# Altium schematic symbol library jlcpcb_2025_04_capacitors_extended_0603.schlib: 3668 symbols (part 16 of 20) (continued)
## GRM188C81C225KA12D
designator C?  Capacitance: 2.2uF  (hidden comment: *)
Capacitor, Ceramic (MLCC), 2.2uF, ±10%, 16V, X6S, ±10%, SMD 0603; Manufacturer: Murata Electronics; Manufacturer Part Number: GRM188C81C225KA12D; Package Size: 0603; JLCPCB Basic Part: No; JLCPCB Part Number: C524624; Supplier 1: LCSC; Category: Capacitors - MLCC; Supplier Part Number 1: C524624; Tolerance: ±10%; Voltage Rating: 16V; Temperature Coefficient: X6S; RoHS: Yes; ComponentLink1Description: Datasheet; ComponentLink1URL: https://wmsc.lcsc.com/wmsc/upload/file/pdf/v2/lcsc/2304140030_Murata-Electronics-GRM188C81C225KA12D_C524624.pdf; ComponentLink2Description: JLCPCB Part URL; ComponentLink2URL: https://jlcpcb.com/partdetail/C524624; ComponentLink3Description: LCSC Part URL; ComponentLink3URL: https://lcsc.com/product-detail/Multilayer-Ceramic-Capacitors-MLCC---SMD-SMT_Murata-Electronics-Murata-Electronics-GRM188C81C225KA12D_C524624.html
footprint CAP-0603 (0603 (1608M) Capacitor)
pins: 1, 2

## GRM188C81C475KE11D
designator C?  Capacitance: 4.7uF  (hidden comment: *)
Capacitor, Ceramic (MLCC), 4.7uF, ±10%, 16V, X6S, ±10%, SMD 0603; Manufacturer: Murata Electronics; Manufacturer Part Number: GRM188C81C475KE11D; Package Size: 0603; JLCPCB Basic Part: No; JLCPCB Part Number: C464980; Supplier 1: LCSC; Category: Capacitors - MLCC; Supplier Part Number 1: C464980; Tolerance: ±10%; Voltage Rating: 16V; Temperature Coefficient: X6S; RoHS: Yes; ComponentLink1Description: Datasheet; ComponentLink1URL: https://wmsc.lcsc.com/wmsc/upload/file/pdf/v2/lcsc/1912111437_Murata-Electronics-GRM188C81C475KE11D_C464980.pdf; ComponentLink2Description: JLCPCB Part URL; ComponentLink2URL: https://jlcpcb.com/partdetail/C464980; ComponentLink3Description: LCSC Part URL; ComponentLink3URL: https://lcsc.com/product-detail/Multilayer-Ceramic-Capacitors-MLCC---SMD-SMT_Murata-Electronics-Murata-Electronics-GRM188C81C475KE11D_C464980.html
footprint CAP-0603 (0603 (1608M) Capacitor)
pins: 1, 2

## GRM188C81E225KE11D
designator C?  Capacitance: 2.2uF  (hidden comment: *)
Capacitor, Ceramic (MLCC), 2.2uF, ±10%, 25V, X6S, ±10%, SMD 0603; Manufacturer: Murata Electronics; Manufacturer Part Number: GRM188C81E225KE11D; Package Size: 0603; JLCPCB Basic Part: No; JLCPCB Part Number: C464411; Supplier 1: LCSC; Category: Capacitors - MLCC; Supplier Part Number 1: C464411; Tolerance: ±10%; Voltage Rating: 25V; Temperature Coefficient: X6S; RoHS: Yes; ComponentLink1Description: Datasheet; ComponentLink1URL: https://wmsc.lcsc.com/wmsc/upload/file/pdf/v2/lcsc/2304140030_Murata-Electronics-GRM188C81E225KE11D_C464411.pdf; ComponentLink2Description: JLCPCB Part URL; ComponentLink2URL: https://jlcpcb.com/partdetail/C464411; ComponentLink3Description: LCSC Part URL; ComponentLink3URL: https://lcsc.com/product-detail/Multilayer-Ceramic-Capacitors-MLCC---SMD-SMT_Murata-Electronics-Murata-Electronics-GRM188C81E225KE11D_C464411.html
footprint CAP-0603 (0603 (1608M) Capacitor)
pins: 1, 2

## GRM188C81E475KE11D
designator C?  Capacitance: 4.7uF  (hidden comment: *)
Capacitor, Ceramic (MLCC), 4.7uF, ±10%, 25V, X6S, ±10%, SMD 0603; Manufacturer: Murata Electronics; Manufacturer Part Number: GRM188C81E475KE11D; Package Size: 0603; JLCPCB Basic Part: No; JLCPCB Part Number: C417145; Supplier 1: LCSC; Category: Capacitors - MLCC; Supplier Part Number 1: C417145; Tolerance: ±10%; Voltage Rating: 25V; Temperature Coefficient: X6S; RoHS: Yes; ComponentLink1Description: Datasheet; ComponentLink1URL: https://wmsc.lcsc.com/wmsc/upload/file/pdf/v2/lcsc/2012241539_Murata-Electronics-GRM188C81E475KE11D_C417145.pdf; ComponentLink2Description: JLCPCB Part URL; ComponentLink2URL: https://jlcpcb.com/partdetail/C417145; ComponentLink3Description: LCSC Part URL; ComponentLink3URL: https://lcsc.com/product-detail/Multilayer-Ceramic-Capacitors-MLCC---SMD-SMT_Murata-Electronics-Murata-Electronics-GRM188C81E475KE11D_C417145.html
footprint CAP-0603 (0603 (1608M) Capacitor)
pins: 1, 2

## GRM188D71A106KA73D
designator C?  Capacitance: 10uF  (hidden comment: *)
Capacitor, Ceramic (MLCC), 10uF, ±10%, 10V, X7T, ±10%, SMD 0603; Manufacturer: Murata Electronics; Manufacturer Part Number: GRM188D71A106KA73D; Package Size: 0603; JLCPCB Basic Part: No; JLCPCB Part Number: C385037; Supplier 1: LCSC; Category: Capacitors - MLCC; Supplier Part Number 1: C385037; Tolerance: ±10%; Voltage Rating: 10V; Temperature Coefficient: X7T; RoHS: Yes; ComponentLink1Description: Datasheet; ComponentLink1URL: https://wmsc.lcsc.com/wmsc/upload/file/pdf/v2/lcsc/1912111437_Murata-Electronics-GRM188D71A106KA73D_C385037.pdf; ComponentLink2Description: JLCPCB Part URL; ComponentLink2URL: https://jlcpcb.com/partdetail/C385037; ComponentLink3Description: LCSC Part URL; ComponentLink3URL: https://lcsc.com/product-detail/Multilayer-Ceramic-Capacitors-MLCC---SMD-SMT_Murata-Electronics-Murata-Electronics-GRM188D71A106KA73D_C385037.html
footprint CAP-0603 (0603 (1608M) Capacitor)
pins: 1, 2

## GRM188D71A106MA73D
designator C?  Capacitance: 10uF  (hidden comment: *)
Capacitor, Ceramic (MLCC), 10uF, ±20%, 10V, X7T, ±20%, SMD 0603; Manufacturer: Murata Electronics; Manufacturer Part Number: GRM188D71A106MA73D; Package Size: 0603; JLCPCB Basic Part: No; JLCPCB Part Number: C162270; Supplier 1: LCSC; Category: Capacitors - MLCC; Supplier Part Number 1: C162270; Tolerance: ±20%; Voltage Rating: 10V; Temperature Coefficient: X7T; RoHS: Yes; ComponentLink1Description: Datasheet; ComponentLink1URL: https://wmsc.lcsc.com/wmsc/upload/file/pdf/v2/lcsc/1912111437_Murata-Electronics-GRM188D71A106MA73D_C162270.pdf; ComponentLink2Description: JLCPCB Part URL; ComponentLink2URL: https://jlcpcb.com/partdetail/C162270; ComponentLink3Description: LCSC Part URL; ComponentLink3URL: https://lcsc.com/product-detail/Multilayer-Ceramic-Capacitors-MLCC---SMD-SMT_Murata-Electronics-Murata-Electronics-GRM188D71A106MA73D_C162270.html
footprint CAP-0603 (0603 (1608M) Capacitor)
pins: 1, 2

## GRM188D71A475ME11D
designator C?  Capacitance: 4.7uF  (hidden comment: *)
Capacitor, Ceramic (MLCC), 4.7uF, ±20%, 10V, X7T, ±20%, SMD 0603; Manufacturer: Murata Electronics; Manufacturer Part Number: GRM188D71A475ME11D; Package Size: 0603; JLCPCB Basic Part: No; JLCPCB Part Number: C1845601; Supplier 1: LCSC; Category: Capacitors - MLCC; Supplier Part Number 1: C1845601; Tolerance: ±20%; Voltage Rating: 10V; Temperature Coefficient: X7T; RoHS: Yes; ComponentLink1Description: Datasheet; ComponentLink1URL: https://wmsc.lcsc.com/wmsc/upload/file/pdf/v2/lcsc/2201270630_Murata-Electronics-GRM188D71A475ME11D_C1845601.pdf; ComponentLink2Description: JLCPCB Part URL; ComponentLink2URL: https://jlcpcb.com/partdetail/C1845601; ComponentLink3Description: LCSC Part URL; ComponentLink3URL: https://lcsc.com/product-detail/Multilayer-Ceramic-Capacitors-MLCC---SMD-SMT_Murata-Electronics-Murata-Electronics-GRM188D71A475ME11D_C1845601.html
footprint CAP-0603 (0603 (1608M) Capacitor)
pins: 1, 2

## GRM188F11E473ZA01D
designator C?  Capacitance: 47nF  (hidden comment: *)
Capacitor, Ceramic (MLCC), 47nF, 25V, SMD 0603; Manufacturer: Murata Electronics; Manufacturer Part Number: GRM188F11E473ZA01D; Temperature Rating: -20%~+80%; Package Size: 0603; JLCPCB Basic Part: No; JLCPCB Part Number: C464444; Supplier 1: LCSC; Category: Capacitors - MLCC; Supplier Part Number 1: C464444; Voltage Rating: 25V; RoHS: Yes; ComponentLink1Description: Datasheet; ComponentLink1URL: https://wmsc.lcsc.com/wmsc/upload/file/pdf/v2/lcsc/2304140030_Murata-Electronics-GRM188F11E473ZA01D_C464444.pdf; ComponentLink2Description: JLCPCB Part URL; ComponentLink2URL: https://jlcpcb.com/partdetail/C464444; ComponentLink3Description: LCSC Part URL; ComponentLink3URL: https://lcsc.com/product-detail/Multilayer-Ceramic-Capacitors-MLCC---SMD-SMT_Murata-Electronics-Murata-Electronics-GRM188F11E473ZA01D_C464444.html
footprint CAP-0603 (0603 (1608M) Capacitor)
pins: 1, 2

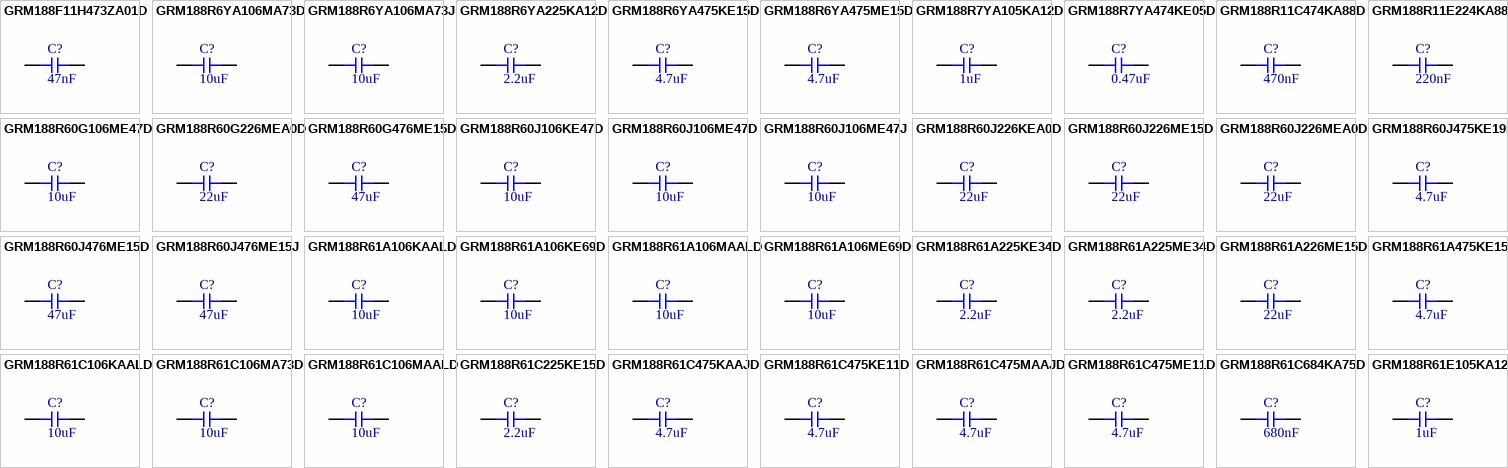
[diagram p73: symbols GRM188F11H473ZA01D to GRM188R61E105KA12D]

## GRM188F11H473ZA01D
designator C?  Capacitance: 47nF  (hidden comment: *)
Capacitor, Ceramic (MLCC), 47nF, 50V, SMD 0603; Manufacturer: Murata Electronics; Manufacturer Part Number: GRM188F11H473ZA01D; Temperature Rating: -20%~+80%; Package Size: 0603; JLCPCB Basic Part: No; JLCPCB Part Number: C86000; Supplier 1: LCSC; Category: Capacitors - MLCC; Supplier Part Number 1: C86000; Voltage Rating: 50V; RoHS: Yes; ComponentLink1Description: Datasheet; ComponentLink1URL: https://wmsc.lcsc.com/wmsc/upload/file/pdf/v2/lcsc/1810311110_Murata-Electronics-GRM188F11H473ZA01D_C86000.pdf; ComponentLink2Description: JLCPCB Part URL; ComponentLink2URL: https://jlcpcb.com/partdetail/C86000; ComponentLink3Description: LCSC Part URL; ComponentLink3URL: https://lcsc.com/product-detail/Multilayer-Ceramic-Capacitors-MLCC---SMD-SMT_Murata-Electronics-Murata-Electronics-GRM188F11H473ZA01D_C86000.html
footprint CAP-0603 (0603 (1608M) Capacitor)
pins: 1, 2

## GRM188R6YA106MA73D
designator C?  Capacitance: 10uF  (hidden comment: *)
Capacitor, Ceramic (MLCC), 10uF, ±20%, 35V, X5R, ±20%, SMD 0603; Manufacturer: Murata Electronics; Manufacturer Part Number: GRM188R6YA106MA73D; Package Size: 0603; JLCPCB Basic Part: No; JLCPCB Part Number: C194427; Supplier 1: LCSC; Category: Capacitors - MLCC; Supplier Part Number 1: C194427; Tolerance: ±20%; Voltage Rating: 35V; Temperature Coefficient: X5R; RoHS: Yes; ComponentLink1Description: Datasheet; ComponentLink1URL: https://wmsc.lcsc.com/wmsc/upload/file/pdf/v2/lcsc/2101281737_Murata-Electronics-GRM188R6YA106MA73D_C194427.pdf; ComponentLink2Description: JLCPCB Part URL; ComponentLink2URL: https://jlcpcb.com/partdetail/C194427; ComponentLink3Description: LCSC Part URL; ComponentLink3URL: https://lcsc.com/product-detail/Multilayer-Ceramic-Capacitors-MLCC---SMD-SMT_Murata-Electronics-Murata-Electronics-GRM188R6YA106MA73D_C194427.html
footprint CAP-0603 (0603 (1608M) Capacitor)
pins: 1, 2

## GRM188R6YA106MA73J
designator C?  Capacitance: 10uF  (hidden comment: *)
Capacitor, Ceramic (MLCC), 10uF, ±20%, 35V, X5R, ±20%, SMD 0603; Manufacturer: Murata Electronics; Manufacturer Part Number: GRM188R6YA106MA73J; Package Size: 0603; JLCPCB Basic Part: No; JLCPCB Part Number: C2244191; Supplier 1: LCSC; Category: Capacitors - MLCC; Supplier Part Number 1: C2244191; Tolerance: ±20%; Voltage Rating: 35V; Temperature Coefficient: X5R; RoHS: Yes; ComponentLink1Description: Datasheet; ComponentLink1URL: https://wmsc.lcsc.com/wmsc/upload/file/pdf/v2/lcsc/2104141220_Murata-Electronics-GRM188R6YA106MA73J_C2244191.pdf; ComponentLink2Description: JLCPCB Part URL; ComponentLink2URL: https://jlcpcb.com/partdetail/C2244191; ComponentLink3Description: LCSC Part URL; ComponentLink3URL: https://lcsc.com/product-detail/Multilayer-Ceramic-Capacitors-MLCC---SMD-SMT_Murata-Electronics-Murata-Electronics-GRM188R6YA106MA73J_C2244191.html
footprint CAP-0603 (0603 (1608M) Capacitor)
pins: 1, 2

## GRM188R6YA225KA12D
designator C?  Capacitance: 2.2uF  (hidden comment: *)
Capacitor, Ceramic (MLCC), 2.2uF, ±10%, 35V, X5R, ±10%, SMD 0603; Manufacturer: Murata Electronics; Manufacturer Part Number: GRM188R6YA225KA12D; Package Size: 0603; JLCPCB Basic Part: No; JLCPCB Part Number: C86017; Supplier 1: LCSC; Category: Capacitors - MLCC; Supplier Part Number 1: C86017; Tolerance: ±10%; Voltage Rating: 35V; Temperature Coefficient: X5R; RoHS: Yes; ComponentLink1Description: Datasheet; ComponentLink1URL: https://wmsc.lcsc.com/wmsc/upload/file/pdf/v2/lcsc/2304140030_Murata-Electronics-GRM188R6YA225KA12D_C86017.pdf; ComponentLink2Description: JLCPCB Part URL; ComponentLink2URL: https://jlcpcb.com/partdetail/C86017; ComponentLink3Description: LCSC Part URL; ComponentLink3URL: https://lcsc.com/product-detail/Multilayer-Ceramic-Capacitors-MLCC---SMD-SMT_Murata-Electronics-Murata-Electronics-GRM188R6YA225KA12D_C86017.html
footprint CAP-0603 (0603 (1608M) Capacitor)
pins: 1, 2

## GRM188R6YA475KE15D
designator C?  Capacitance: 4.7uF  (hidden comment: *)
Capacitor, Ceramic (MLCC), 4.7uF, ±10%, 35V, X5R, ±10%, SMD 0603; Manufacturer: Murata Electronics; Manufacturer Part Number: GRM188R6YA475KE15D; Package Size: 0603; JLCPCB Basic Part: No; JLCPCB Part Number: C162274; Supplier 1: LCSC; Category: Capacitors - MLCC; Supplier Part Number 1: C162274; Tolerance: ±10%; Voltage Rating: 35V; Temperature Coefficient: X5R; RoHS: Yes; ComponentLink1Description: Datasheet; ComponentLink1URL: https://wmsc.lcsc.com/wmsc/upload/file/pdf/v2/lcsc/2304140030_Murata-Electronics-GRM188R6YA475KE15D_C162274.pdf; ComponentLink2Description: JLCPCB Part URL; ComponentLink2URL: https://jlcpcb.com/partdetail/C162274; ComponentLink3Description: LCSC Part URL; ComponentLink3URL: https://lcsc.com/product-detail/Multilayer-Ceramic-Capacitors-MLCC---SMD-SMT_Murata-Electronics-Murata-Electronics-GRM188R6YA475KE15D_C162274.html
footprint CAP-0603 (0603 (1608M) Capacitor)
pins: 1, 2

## GRM188R6YA475ME15D
designator C?  Capacitance: 4.7uF  (hidden comment: *)
Capacitor, Ceramic (MLCC), 4.7uF, ±20%, 35V, X5R, ±20%, SMD 0603; Manufacturer: Murata Electronics; Manufacturer Part Number: GRM188R6YA475ME15D; Package Size: 0603; JLCPCB Basic Part: No; JLCPCB Part Number: C237391; Supplier 1: LCSC; Category: Capacitors - MLCC; Supplier Part Number 1: C237391; Tolerance: ±20%; Voltage Rating: 35V; Temperature Coefficient: X5R; RoHS: Yes; ComponentLink1Description: Datasheet; ComponentLink1URL: https://wmsc.lcsc.com/wmsc/upload/file/pdf/v2/lcsc/2304140030_Murata-Electronics-GRM188R6YA475ME15D_C237391.pdf; ComponentLink2Description: JLCPCB Part URL; ComponentLink2URL: https://jlcpcb.com/partdetail/C237391; ComponentLink3Description: LCSC Part URL; ComponentLink3URL: https://lcsc.com/product-detail/Multilayer-Ceramic-Capacitors-MLCC---SMD-SMT_Murata-Electronics-Murata-Electronics-GRM188R6YA475ME15D_C237391.html
footprint CAP-0603 (0603 (1608M) Capacitor)
pins: 1, 2

## GRM188R7YA105KA12D
designator C?  Capacitance: 1uF  (hidden comment: *)
Capacitor, Ceramic (MLCC), 1uF, ±10%, 35V, X7R, ±10%, SMD 0603; Manufacturer: Murata Electronics; Manufacturer Part Number: GRM188R7YA105KA12D; Package Size: 0603; JLCPCB Basic Part: No; JLCPCB Part Number: C162280; Supplier 1: LCSC; Category: Capacitors - MLCC; Supplier Part Number 1: C162280; Tolerance: ±10%; Voltage Rating: 35V; Temperature Coefficient: X7R; RoHS: Yes; ComponentLink1Description: Datasheet; ComponentLink1URL: https://wmsc.lcsc.com/wmsc/upload/file/pdf/v2/lcsc/2304140030_Murata-Electronics-GRM188R7YA105KA12D_C162280.pdf; ComponentLink2Description: JLCPCB Part URL; ComponentLink2URL: https://jlcpcb.com/partdetail/C162280; ComponentLink3Description: LCSC Part URL; ComponentLink3URL: https://lcsc.com/product-detail/Multilayer-Ceramic-Capacitors-MLCC---SMD-SMT_Murata-Electronics-Murata-Electronics-GRM188R7YA105KA12D_C162280.html
footprint CAP-0603 (0603 (1608M) Capacitor)
pins: 1, 2

## GRM188R7YA474KE05D
designator C?  Capacitance: 0.47uF  (hidden comment: *)
Capacitor, Ceramic (MLCC), 0.47uF, ±10%, 35V, X7R, ±10%, SMD 0603; Manufacturer: Murata Electronics; Manufacturer Part Number: GRM188R7YA474KE05D; Package Size: 0603; JLCPCB Basic Part: No; JLCPCB Part Number: C162281; Supplier 1: LCSC; Category: Capacitors - MLCC; Supplier Part Number 1: C162281; Tolerance: ±10%; Voltage Rating: 35V; Temperature Coefficient: X7R; RoHS: Yes; ComponentLink1Description: Datasheet; ComponentLink1URL: https://wmsc.lcsc.com/wmsc/upload/file/pdf/v2/lcsc/2308111507_Murata-Electronics-GRM188R7YA474KE05D_C162281.pdf; ComponentLink2Description: JLCPCB Part URL; ComponentLink2URL: https://jlcpcb.com/partdetail/C162281; ComponentLink3Description: LCSC Part URL; ComponentLink3URL: https://lcsc.com/product-detail/Multilayer-Ceramic-Capacitors-MLCC---SMD-SMT_Murata-Electronics-Murata-Electronics-GRM188R7YA474KE05D_C162281.html
footprint CAP-0603 (0603 (1608M) Capacitor)
pins: 1, 2

## GRM188R11C474KA88D
designator C?  Capacitance: 470nF  (hidden comment: *)
Capacitor, Ceramic (MLCC), 470nF, ±10%, 16V, R, ±10%, SMD 0603; Manufacturer: Murata Electronics; Manufacturer Part Number: GRM188R11C474KA88D; Package Size: 0603; JLCPCB Basic Part: No; JLCPCB Part Number: C415546; Supplier 1: LCSC; Category: Capacitors - MLCC; Supplier Part Number 1: C415546; Tolerance: ±10%; Voltage Rating: 16V; Temperature Coefficient: R; RoHS: Yes; ComponentLink1Description: Datasheet; ComponentLink1URL: https://wmsc.lcsc.com/wmsc/upload/file/pdf/v2/lcsc/2304140030_Murata-Electronics-GRM188R11C474KA88D_C415546.pdf; ComponentLink2Description: JLCPCB Part URL; ComponentLink2URL: https://jlcpcb.com/partdetail/C415546; ComponentLink3Description: LCSC Part URL; ComponentLink3URL: https://lcsc.com/product-detail/Multilayer-Ceramic-Capacitors-MLCC---SMD-SMT_Murata-Electronics-Murata-Electronics-GRM188R11C474KA88D_C415546.html
footprint CAP-0603 (0603 (1608M) Capacitor)
pins: 1, 2

## GRM188R11E224KA88D
designator C?  Capacitance: 220nF  (hidden comment: *)
Capacitor, Ceramic (MLCC), 220nF, ±10%, 25V, R, ±10%, SMD 0603; Manufacturer: Murata Electronics; Manufacturer Part Number: GRM188R11E224KA88D; Package Size: 0603; JLCPCB Basic Part: No; JLCPCB Part Number: C471386; Supplier 1: LCSC; Category: Capacitors - MLCC; Supplier Part Number 1: C471386; Tolerance: ±10%; Voltage Rating: 25V; Temperature Coefficient: R; RoHS: Yes; ComponentLink1Description: Datasheet; ComponentLink1URL: https://wmsc.lcsc.com/wmsc/upload/file/pdf/v2/lcsc/2308111810_Murata-Electronics-GRM188R11E224KA88D_C471386.pdf; ComponentLink2Description: JLCPCB Part URL; ComponentLink2URL: https://jlcpcb.com/partdetail/C471386; ComponentLink3Description: LCSC Part URL; ComponentLink3URL: https://lcsc.com/product-detail/Multilayer-Ceramic-Capacitors-MLCC---SMD-SMT_Murata-Electronics-Murata-Electronics-GRM188R11E224KA88D_C471386.html
footprint CAP-0603 (0603 (1608M) Capacitor)
pins: 1, 2

## GRM188R60G106ME47D
designator C?  Capacitance: 10uF  (hidden comment: *)
Capacitor, Ceramic (MLCC), 10uF, ±20%, 4V, X5R, ±20%, SMD 0603; Manufacturer: Murata Electronics; Manufacturer Part Number: GRM188R60G106ME47D; Package Size: 0603; JLCPCB Basic Part: No; JLCPCB Part Number: C97885; Supplier 1: LCSC; Category: Capacitors - MLCC; Supplier Part Number 1: C97885; Tolerance: ±20%; Voltage Rating: 4V; Temperature Coefficient: X5R; RoHS: Yes; ComponentLink1Description: Datasheet; ComponentLink1URL: https://wmsc.lcsc.com/wmsc/upload/file/pdf/v2/lcsc/1810311135_Murata-Electronics-GRM188R60G106ME47D_C97885.pdf; ComponentLink2Description: JLCPCB Part URL; ComponentLink2URL: https://jlcpcb.com/partdetail/C97885; ComponentLink3Description: LCSC Part URL; ComponentLink3URL: https://lcsc.com/product-detail/Multilayer-Ceramic-Capacitors-MLCC---SMD-SMT_Murata-Electronics-Murata-Electronics-GRM188R60G106ME47D_C97885.html
footprint CAP-0603 (0603 (1608M) Capacitor)
pins: 1, 2

## GRM188R60G226MEA0D
designator C?  Capacitance: 22uF  (hidden comment: *)
Capacitor, Ceramic (MLCC), 22uF, ±20%, 4V, X5R, ±20%, SMD 0603; Manufacturer: Murata Electronics; Manufacturer Part Number: GRM188R60G226MEA0D; Package Size: 0603; JLCPCB Basic Part: No; JLCPCB Part Number: C913769; Supplier 1: LCSC; Category: Capacitors - MLCC; Supplier Part Number 1: C913769; Tolerance: ±20%; Voltage Rating: 4V; Temperature Coefficient: X5R; RoHS: Yes; ComponentLink1Description: Datasheet; ComponentLink1URL: https://wmsc.lcsc.com/wmsc/upload/file/pdf/v2/lcsc/2201131300_Murata-Electronics-GRM188R60G226MEA0D_C913769.pdf; ComponentLink2Description: JLCPCB Part URL; ComponentLink2URL: https://jlcpcb.com/partdetail/C913769; ComponentLink3Description: LCSC Part URL; ComponentLink3URL: https://lcsc.com/product-detail/Multilayer-Ceramic-Capacitors-MLCC---SMD-SMT_Murata-Electronics-Murata-Electronics-GRM188R60G226MEA0D_C913769.html
footprint CAP-0603 (0603 (1608M) Capacitor)
pins: 1, 2

## GRM188R60G476ME15D
designator C?  Capacitance: 47uF  (hidden comment: *)
Capacitor, Ceramic (MLCC), 47uF, ±20%, 4V, X5R, ±20%, SMD 0603; Manufacturer: Murata Electronics; Manufacturer Part Number: GRM188R60G476ME15D; Package Size: 0603; JLCPCB Basic Part: No; JLCPCB Part Number: C426032; Supplier 1: LCSC; Category: Capacitors - MLCC; Supplier Part Number 1: C426032; Tolerance: ±20%; Voltage Rating: 4V; Temperature Coefficient: X5R; RoHS: Yes; ComponentLink1Description: Datasheet; ComponentLink1URL: https://wmsc.lcsc.com/wmsc/upload/file/pdf/v2/lcsc/2304140030_Murata-Electronics-GRM188R60G476ME15D_C426032.pdf; ComponentLink2Description: JLCPCB Part URL; ComponentLink2URL: https://jlcpcb.com/partdetail/C426032; ComponentLink3Description: LCSC Part URL; ComponentLink3URL: https://lcsc.com/product-detail/Multilayer-Ceramic-Capacitors-MLCC---SMD-SMT_Murata-Electronics-Murata-Electronics-GRM188R60G476ME15D_C426032.html
footprint CAP-0603 (0603 (1608M) Capacitor)
pins: 1, 2

## GRM188R60J106KE47D
designator C?  Capacitance: 10uF  (hidden comment: *)
Capacitor, Ceramic (MLCC), 10uF, ±10%, 6.3V, X5R, ±10%, SMD 0603; Manufacturer: Murata Electronics; Manufacturer Part Number: GRM188R60J106KE47D; Package Size: 0603; JLCPCB Basic Part: No; JLCPCB Part Number: C77040; Supplier 1: LCSC; Category: Capacitors - MLCC; Supplier Part Number 1: C77040; Tolerance: ±10%; Voltage Rating: 6.3V; Temperature Coefficient: X5R; RoHS: Yes; ComponentLink1Description: Datasheet; ComponentLink1URL: https://wmsc.lcsc.com/wmsc/upload/file/pdf/v2/lcsc/2304140030_Murata-Electronics-GRM188R60J106KE47D_C77040.pdf; ComponentLink2Description: JLCPCB Part URL; ComponentLink2URL: https://jlcpcb.com/partdetail/C77040; ComponentLink3Description: LCSC Part URL; ComponentLink3URL: https://lcsc.com/product-detail/Multilayer-Ceramic-Capacitors-MLCC---SMD-SMT_Murata-Electronics-Murata-Electronics-GRM188R60J106KE47D_C77040.html
footprint CAP-0603 (0603 (1608M) Capacitor)
pins: 1, 2

## GRM188R60J106ME47D
designator C?  Capacitance: 10uF  (hidden comment: *)
Capacitor, Ceramic (MLCC), 10uF, ±20%, 6.3V, X5R, ±20%, SMD 0603; Manufacturer: Murata Electronics; Manufacturer Part Number: GRM188R60J106ME47D; Package Size: 0603; JLCPCB Basic Part: No; JLCPCB Part Number: C77041; Supplier 1: LCSC; Category: Capacitors - MLCC; Supplier Part Number 1: C77041; Tolerance: ±20%; Voltage Rating: 6.3V; Temperature Coefficient: X5R; RoHS: Yes; ComponentLink1Description: Datasheet; ComponentLink1URL: https://wmsc.lcsc.com/wmsc/upload/file/pdf/v2/lcsc/2304140030_Murata-Electronics-GRM188R60J106ME47D_C77041.pdf; ComponentLink2Description: JLCPCB Part URL; ComponentLink2URL: https://jlcpcb.com/partdetail/C77041; ComponentLink3Description: LCSC Part URL; ComponentLink3URL: https://lcsc.com/product-detail/Multilayer-Ceramic-Capacitors-MLCC---SMD-SMT_Murata-Electronics-Murata-Electronics-GRM188R60J106ME47D_C77041.html
footprint CAP-0603 (0603 (1608M) Capacitor)
pins: 1, 2

## GRM188R60J106ME47J
designator C?  Capacitance: 10uF  (hidden comment: *)
Capacitor, Ceramic (MLCC), 10uF, ±20%, 6.3V, X5R, ±20%, SMD 0603; Manufacturer: Murata Electronics; Manufacturer Part Number: GRM188R60J106ME47J; Package Size: 0603; JLCPCB Basic Part: No; JLCPCB Part Number: C2167837; Supplier 1: LCSC; Category: Capacitors - MLCC; Supplier Part Number 1: C2167837; Tolerance: ±20%; Voltage Rating: 6.3V; Temperature Coefficient: X5R; RoHS: Yes; ComponentLink1Description: Datasheet; ComponentLink1URL: https://wmsc.lcsc.com/wmsc/upload/file/pdf/v2/lcsc/2308111716_Murata-Electronics-GRM188R60J106ME47J_C2167837.pdf; ComponentLink2Description: JLCPCB Part URL; ComponentLink2URL: https://jlcpcb.com/partdetail/C2167837; ComponentLink3Description: LCSC Part URL; ComponentLink3URL: https://lcsc.com/product-detail/Multilayer-Ceramic-Capacitors-MLCC---SMD-SMT_Murata-Electronics-Murata-Electronics-GRM188R60J106ME47J_C2167837.html
footprint CAP-0603 (0603 (1608M) Capacitor)
pins: 1, 2

## GRM188R60J226KEA0D
designator C?  Capacitance: 22uF  (hidden comment: *)
Capacitor, Ceramic (MLCC), 22uF, 6.3V, X5R, SMD 0603; Manufacturer: Murata Electronics; Manufacturer Part Number: GRM188R60J226KEA0D; Package Size: 0603; JLCPCB Basic Part: No; JLCPCB Part Number: C3020456; Supplier 1: LCSC; Category: Capacitors - MLCC; Supplier Part Number 1: C3020456; Voltage Rating: 6.3V; Temperature Coefficient: X5R; RoHS: Yes; ComponentLink1Description: Datasheet; ComponentLink1URL: https://wmsc.lcsc.com/wmsc/upload/file/pdf/v2/lcsc/2205231645_Murata-Electronics-GRM188R60J226KEA0D_C3020456.pdf; ComponentLink2Description: JLCPCB Part URL; ComponentLink2URL: https://jlcpcb.com/partdetail/C3020456; ComponentLink3Description: LCSC Part URL; ComponentLink3URL: https://lcsc.com/product-detail/Multilayer-Ceramic-Capacitors-MLCC---SMD-SMT_Murata-Electronics-Murata-Electronics-GRM188R60J226KEA0D_C3020456.html
footprint CAP-0603 (0603 (1608M) Capacitor)
pins: 1, 2

## GRM188R60J226ME15D
designator C?  Capacitance: 22uF  (hidden comment: *)
Capacitor, Ceramic (MLCC), 22uF, ±20%, 6.3V, X5R, ±20%, SMD 0603; Manufacturer: Murata Electronics; Manufacturer Part Number: GRM188R60J226ME15D; Package Size: 0603; JLCPCB Basic Part: No; JLCPCB Part Number: C440187; Supplier 1: LCSC; Category: Capacitors - MLCC; Supplier Part Number 1: C440187; Tolerance: ±20%; Voltage Rating: 6.3V; Temperature Coefficient: X5R; RoHS: Yes; ComponentLink1Description: Datasheet; ComponentLink1URL: https://wmsc.lcsc.com/wmsc/upload/file/pdf/v2/lcsc/2304140030_Murata-Electronics-GRM188R60J226ME15D_C440187.pdf; ComponentLink2Description: JLCPCB Part URL; ComponentLink2URL: https://jlcpcb.com/partdetail/C440187; ComponentLink3Description: LCSC Part URL; ComponentLink3URL: https://lcsc.com/product-detail/Multilayer-Ceramic-Capacitors-MLCC---SMD-SMT_Murata-Electronics-Murata-Electronics-GRM188R60J226ME15D_C440187.html
footprint CAP-0603 (0603 (1608M) Capacitor)
pins: 1, 2

## GRM188R60J226MEA0D
designator C?  Capacitance: 22uF  (hidden comment: *)
Capacitor, Ceramic (MLCC), 22uF, ±20%, 6.3V, X5R, ±20%, SMD 0603; Manufacturer: Murata Electronics; Manufacturer Part Number: GRM188R60J226MEA0D; Package Size: 0603; JLCPCB Basic Part: No; JLCPCB Part Number: C77042; Supplier 1: LCSC; Category: Capacitors - MLCC; Supplier Part Number 1: C77042; Tolerance: ±20%; Voltage Rating: 6.3V; Temperature Coefficient: X5R; RoHS: Yes; ComponentLink1Description: Datasheet; ComponentLink1URL: https://wmsc.lcsc.com/wmsc/upload/file/pdf/v2/lcsc/2304140030_Murata-Electronics-GRM188R60J226MEA0D_C77042.pdf; ComponentLink2Description: JLCPCB Part URL; ComponentLink2URL: https://jlcpcb.com/partdetail/C77042; ComponentLink3Description: LCSC Part URL; ComponentLink3URL: https://lcsc.com/product-detail/Multilayer-Ceramic-Capacitors-MLCC---SMD-SMT_Murata-Electronics-Murata-Electronics-GRM188R60J226MEA0D_C77042.html
footprint CAP-0603 (0603 (1608M) Capacitor)
pins: 1, 2

## GRM188R60J475KE19D
designator C?  Capacitance: 4.7uF  (hidden comment: *)
Capacitor, Ceramic (MLCC), 4.7uF, ±10%, 6.3V, X5R, ±10%, SMD 0603; Manufacturer: Murata Electronics; Manufacturer Part Number: GRM188R60J475KE19D; Package Size: 0603; JLCPCB Basic Part: No; JLCPCB Part Number: C71631; Supplier 1: LCSC; Category: Capacitors - MLCC; Supplier Part Number 1: C71631; Tolerance: ±10%; Voltage Rating: 6.3V; Temperature Coefficient: X5R; RoHS: Yes; ComponentLink1Description: Datasheet; ComponentLink1URL: https://wmsc.lcsc.com/wmsc/upload/file/pdf/v2/lcsc/1810311122_Murata-Electronics-GRM188R60J475KE19D_C71631.pdf; ComponentLink2Description: JLCPCB Part URL; ComponentLink2URL: https://jlcpcb.com/partdetail/C71631; ComponentLink3Description: LCSC Part URL; ComponentLink3URL: https://lcsc.com/product-detail/Multilayer-Ceramic-Capacitors-MLCC---SMD-SMT_Murata-Electronics-Murata-Electronics-GRM188R60J475KE19D_C71631.html
footprint CAP-0603 (0603 (1608M) Capacitor)
pins: 1, 2

## GRM188R60J476ME15D
designator C?  Capacitance: 47uF  (hidden comment: *)
Capacitor, Ceramic (MLCC), 47uF, ±20%, 6.3V, X5R, ±20%, SMD 0603; Manufacturer: Murata Electronics; Manufacturer Part Number: GRM188R60J476ME15D; Package Size: 0603; JLCPCB Basic Part: No; JLCPCB Part Number: C140782; Supplier 1: LCSC; Category: Capacitors - MLCC; Supplier Part Number 1: C140782; Tolerance: ±20%; Voltage Rating: 6.3V; Temperature Coefficient: X5R; RoHS: Yes; ComponentLink1Description: Datasheet; ComponentLink1URL: https://wmsc.lcsc.com/wmsc/upload/file/pdf/v2/lcsc/1811081617_Murata-Electronics-GRM188R60J476ME15D_C140782.pdf; ComponentLink2Description: JLCPCB Part URL; ComponentLink2URL: https://jlcpcb.com/partdetail/C140782; ComponentLink3Description: LCSC Part URL; ComponentLink3URL: https://lcsc.com/product-detail/Multilayer-Ceramic-Capacitors-MLCC---SMD-SMT_Murata-Electronics-Murata-Electronics-GRM188R60J476ME15D_C140782.html
footprint CAP-0603 (0603 (1608M) Capacitor)
pins: 1, 2

## GRM188R60J476ME15J
designator C?  Capacitance: 47uF  (hidden comment: *)
Capacitor, Ceramic (MLCC), 47uF, ±20%, 6.3V, X5R, ±20%, SMD 0603; Manufacturer: Murata Electronics; Manufacturer Part Number: GRM188R60J476ME15J; Package Size: 0603; JLCPCB Basic Part: No; JLCPCB Part Number: C882513; Supplier 1: LCSC; Category: Capacitors - MLCC; Supplier Part Number 1: C882513; Tolerance: ±20%; Voltage Rating: 6.3V; Temperature Coefficient: X5R; RoHS: Yes; ComponentLink1Description: Datasheet; ComponentLink1URL: https://wmsc.lcsc.com/wmsc/upload/file/pdf/v2/lcsc/2303141000_Murata-Electronics-GRM188R60J476ME15J_C882513.pdf; ComponentLink2Description: JLCPCB Part URL; ComponentLink2URL: https://jlcpcb.com/partdetail/C882513; ComponentLink3Description: LCSC Part URL; ComponentLink3URL: https://lcsc.com/product-detail/Multilayer-Ceramic-Capacitors-MLCC---SMD-SMT_Murata-Electronics-Murata-Electronics-GRM188R60J476ME15J_C882513.html
footprint CAP-0603 (0603 (1608M) Capacitor)
pins: 1, 2

## GRM188R61A106KAALD
designator C?  Capacitance: 10uF  (hidden comment: *)
Capacitor, Ceramic (MLCC), 10uF, ±10%, 10V, X5R, ±10%, SMD 0603; Manufacturer: Murata Electronics; Manufacturer Part Number: GRM188R61A106KAALD; Package Size: 0603; JLCPCB Basic Part: No; JLCPCB Part Number: C703114; Supplier 1: LCSC; Category: Capacitors - MLCC; Supplier Part Number 1: C703114; Tolerance: ±10%; Voltage Rating: 10V; Temperature Coefficient: X5R; RoHS: Yes; ComponentLink1Description: Datasheet; ComponentLink1URL: https://wmsc.lcsc.com/wmsc/upload/file/pdf/v2/lcsc/2304140030_Murata-Electronics-GRM188R61A106KAALD_C703114.pdf; ComponentLink2Description: JLCPCB Part URL; ComponentLink2URL: https://jlcpcb.com/partdetail/C703114; ComponentLink3Description: LCSC Part URL; ComponentLink3URL: https://lcsc.com/product-detail/Multilayer-Ceramic-Capacitors-MLCC---SMD-SMT_Murata-Electronics-Murata-Electronics-GRM188R61A106KAALD_C703114.html
footprint CAP-0603 (0603 (1608M) Capacitor)
pins: 1, 2

## GRM188R61A106KE69D
designator C?  Capacitance: 10uF  (hidden comment: *)
Capacitor, Ceramic (MLCC), 10uF, ±10%, 10V, X5R, ±10%, SMD 0603; Manufacturer: Murata Electronics; Manufacturer Part Number: GRM188R61A106KE69D; Package Size: 0603; JLCPCB Basic Part: No; JLCPCB Part Number: C77044; Supplier 1: LCSC; Category: Capacitors - MLCC; Supplier Part Number 1: C77044; Tolerance: ±10%; Voltage Rating: 10V; Temperature Coefficient: X5R; RoHS: Yes; ComponentLink1Description: Datasheet; ComponentLink1URL: https://wmsc.lcsc.com/wmsc/upload/file/pdf/v2/lcsc/2304140030_Murata-Electronics-GRM188R61A106KE69D_C77044.pdf; ComponentLink2Description: JLCPCB Part URL; ComponentLink2URL: https://jlcpcb.com/partdetail/C77044; ComponentLink3Description: LCSC Part URL; ComponentLink3URL: https://lcsc.com/product-detail/Multilayer-Ceramic-Capacitors-MLCC---SMD-SMT_Murata-Electronics-Murata-Electronics-GRM188R61A106KE69D_C77044.html
footprint CAP-0603 (0603 (1608M) Capacitor)
pins: 1, 2

## GRM188R61A106MAALD
designator C?  Capacitance: 10uF  (hidden comment: *)
Capacitor, Ceramic (MLCC), 10uF, ±20%, 10V, X5R, ±20%, SMD 0603; Manufacturer: Murata Electronics; Manufacturer Part Number: GRM188R61A106MAALD; Package Size: 0603; JLCPCB Basic Part: No; JLCPCB Part Number: C703113; Supplier 1: LCSC; Category: Capacitors - MLCC; Supplier Part Number 1: C703113; Tolerance: ±20%; Voltage Rating: 10V; Temperature Coefficient: X5R; RoHS: Yes; ComponentLink1Description: Datasheet; ComponentLink1URL: https://wmsc.lcsc.com/wmsc/upload/file/pdf/v2/lcsc/2304140030_Murata-Electronics-GRM188R61A106MAALD_C703113.pdf; ComponentLink2Description: JLCPCB Part URL; ComponentLink2URL: https://jlcpcb.com/partdetail/C703113; ComponentLink3Description: LCSC Part URL; ComponentLink3URL: https://lcsc.com/product-detail/Multilayer-Ceramic-Capacitors-MLCC---SMD-SMT_Murata-Electronics-Murata-Electronics-GRM188R61A106MAALD_C703113.html
footprint CAP-0603 (0603 (1608M) Capacitor)
pins: 1, 2

## GRM188R61A106ME69D
designator C?  Capacitance: 10uF  (hidden comment: *)
Capacitor, Ceramic (MLCC), 10uF, ±20%, 10V, X5R, ±20%, SMD 0603; Manufacturer: Murata Electronics; Manufacturer Part Number: GRM188R61A106ME69D; Package Size: 0603; JLCPCB Basic Part: No; JLCPCB Part Number: C90053; Supplier 1: LCSC; Category: Capacitors - MLCC; Supplier Part Number 1: C90053; Tolerance: ±20%; Voltage Rating: 10V; Temperature Coefficient: X5R; RoHS: Yes; ComponentLink1Description: Datasheet; ComponentLink1URL: https://wmsc.lcsc.com/wmsc/upload/file/pdf/v2/lcsc/1804251310_Murata-Electronics-GRM188R61A106ME69D_C90053.pdf; ComponentLink2Description: JLCPCB Part URL; ComponentLink2URL: https://jlcpcb.com/partdetail/C90053; ComponentLink3Description: LCSC Part URL; ComponentLink3URL: https://lcsc.com/product-detail/Multilayer-Ceramic-Capacitors-MLCC---SMD-SMT_Murata-Electronics-Murata-Electronics-GRM188R61A106ME69D_C90053.html
footprint CAP-0603 (0603 (1608M) Capacitor)
pins: 1, 2

## GRM188R61A225KE34D
designator C?  Capacitance: 2.2uF  (hidden comment: *)
Capacitor, Ceramic (MLCC), 2.2uF, ±10%, 10V, X5R, ±10%, SMD 0603; Manufacturer: Murata Electronics; Manufacturer Part Number: GRM188R61A225KE34D; Package Size: 0603; JLCPCB Basic Part: No; JLCPCB Part Number: C86013; Supplier 1: LCSC; Category: Capacitors - MLCC; Supplier Part Number 1: C86013; Tolerance: ±10%; Voltage Rating: 10V; Temperature Coefficient: X5R; RoHS: Yes; ComponentLink1Description: Datasheet; ComponentLink1URL: https://wmsc.lcsc.com/wmsc/upload/file/pdf/v2/lcsc/2304140030_Murata-Electronics-GRM188R61A225KE34D_C86013.pdf; ComponentLink2Description: JLCPCB Part URL; ComponentLink2URL: https://jlcpcb.com/partdetail/C86013; ComponentLink3Description: LCSC Part URL; ComponentLink3URL: https://lcsc.com/product-detail/Multilayer-Ceramic-Capacitors-MLCC---SMD-SMT_Murata-Electronics-Murata-Electronics-GRM188R61A225KE34D_C86013.html
footprint CAP-0603 (0603 (1608M) Capacitor)
pins: 1, 2

## GRM188R61A225ME34D
designator C?  Capacitance: 2.2uF  (hidden comment: *)
Capacitor, Ceramic (MLCC), 2.2uF, ±20%, 10V, X5R, ±20%, SMD 0603; Manufacturer: Murata Electronics; Manufacturer Part Number: GRM188R61A225ME34D; Package Size: 0603; JLCPCB Basic Part: No; JLCPCB Part Number: C408136; Supplier 1: LCSC; Category: Capacitors - MLCC; Supplier Part Number 1: C408136; Tolerance: ±20%; Voltage Rating: 10V; Temperature Coefficient: X5R; RoHS: Yes; ComponentLink1Description: Datasheet; ComponentLink1URL: https://wmsc.lcsc.com/wmsc/upload/file/pdf/v2/lcsc/2304140030_Murata-Electronics-GRM188R61A225ME34D_C408136.pdf; ComponentLink2Description: JLCPCB Part URL; ComponentLink2URL: https://jlcpcb.com/partdetail/C408136; ComponentLink3Description: LCSC Part URL; ComponentLink3URL: https://lcsc.com/product-detail/Multilayer-Ceramic-Capacitors-MLCC---SMD-SMT_Murata-Electronics-Murata-Electronics-GRM188R61A225ME34D_C408136.html
footprint CAP-0603 (0603 (1608M) Capacitor)
pins: 1, 2

## GRM188R61A226ME15D
designator C?  Capacitance: 22uF  (hidden comment: *)
Capacitor, Ceramic (MLCC), 22uF, ±20%, 10V, X5R, ±20%, SMD 0603; Manufacturer: Murata Electronics; Manufacturer Part Number: GRM188R61A226ME15D; Package Size: 0603; JLCPCB Basic Part: No; JLCPCB Part Number: C84419; Supplier 1: LCSC; Category: Capacitors - MLCC; Supplier Part Number 1: C84419; Tolerance: ±20%; Voltage Rating: 10V; Temperature Coefficient: X5R; RoHS: Yes; ComponentLink1Description: Datasheet; ComponentLink1URL: https://wmsc.lcsc.com/wmsc/upload/file/pdf/v2/lcsc/1810311140_Murata-Electronics-GRM188R61A226ME15D_C84419.pdf; ComponentLink2Description: JLCPCB Part URL; ComponentLink2URL: https://jlcpcb.com/partdetail/C84419; ComponentLink3Description: LCSC Part URL; ComponentLink3URL: https://lcsc.com/product-detail/Multilayer-Ceramic-Capacitors-MLCC---SMD-SMT_Murata-Electronics-Murata-Electronics-GRM188R61A226ME15D_C84419.html
footprint CAP-0603 (0603 (1608M) Capacitor)
pins: 1, 2

## GRM188R61A475KE15D
designator C?  Capacitance: 4.7uF  (hidden comment: *)
Capacitor, Ceramic (MLCC), 4.7uF, ±10%, 10V, X5R, ±10%, SMD 0603; Manufacturer: Murata Electronics; Manufacturer Part Number: GRM188R61A475KE15D; Package Size: 0603; JLCPCB Basic Part: No; JLCPCB Part Number: C71633; Supplier 1: LCSC; Category: Capacitors - MLCC; Supplier Part Number 1: C71633; Tolerance: ±10%; Voltage Rating: 10V; Temperature Coefficient: X5R; RoHS: Yes; ComponentLink1Description: Datasheet; ComponentLink1URL: https://wmsc.lcsc.com/wmsc/upload/file/pdf/v2/lcsc/1810311122_Murata-Electronics-GRM188R61A475KE15D_C71633.pdf; ComponentLink2Description: JLCPCB Part URL; ComponentLink2URL: https://jlcpcb.com/partdetail/C71633; ComponentLink3Description: LCSC Part URL; ComponentLink3URL: https://lcsc.com/product-detail/Multilayer-Ceramic-Capacitors-MLCC---SMD-SMT_Murata-Electronics-Murata-Electronics-GRM188R61A475KE15D_C71633.html
footprint CAP-0603 (0603 (1608M) Capacitor)
pins: 1, 2

## GRM188R61C106KAALD
designator C?  Capacitance: 10uF  (hidden comment: *)
Capacitor, Ceramic (MLCC), 10uF, ±10%, 16V, X5R, ±10%, SMD 0603; Manufacturer: Murata Electronics; Manufacturer Part Number: GRM188R61C106KAALD; Package Size: 0603; JLCPCB Basic Part: No; JLCPCB Part Number: C86275; Supplier 1: LCSC; Category: Capacitors - MLCC; Supplier Part Number 1: C86275; Tolerance: ±10%; Voltage Rating: 16V; Temperature Coefficient: X5R; RoHS: Yes; ComponentLink1Description: Datasheet; ComponentLink1URL: https://wmsc.lcsc.com/wmsc/upload/file/pdf/v2/lcsc/2308111814_Murata-Electronics-GRM188R61C106KAALD_C86275.pdf; ComponentLink2Description: JLCPCB Part URL; ComponentLink2URL: https://jlcpcb.com/partdetail/C86275; ComponentLink3Description: LCSC Part URL; ComponentLink3URL: https://lcsc.com/product-detail/Multilayer-Ceramic-Capacitors-MLCC---SMD-SMT_Murata-Electronics-Murata-Electronics-GRM188R61C106KAALD_C86275.html
footprint CAP-0603 (0603 (1608M) Capacitor)
pins: 1, 2

## GRM188R61C106MA73D
designator C?  Capacitance: 10uF  (hidden comment: *)
Capacitor, Ceramic (MLCC), 10uF, ±20%, 16V, X5R, ±20%, SMD 0603; Manufacturer: Murata Electronics; Manufacturer Part Number: GRM188R61C106MA73D; Package Size: 0603; JLCPCB Basic Part: No; JLCPCB Part Number: C86277; Supplier 1: LCSC; Category: Capacitors - MLCC; Supplier Part Number 1: C86277; Tolerance: ±20%; Voltage Rating: 16V; Temperature Coefficient: X5R; RoHS: Yes; ComponentLink1Description: Datasheet; ComponentLink1URL: https://wmsc.lcsc.com/wmsc/upload/file/pdf/v2/lcsc/1810311121_Murata-Electronics-GRM188R61C106MA73D_C86277.pdf; ComponentLink2Description: JLCPCB Part URL; ComponentLink2URL: https://jlcpcb.com/partdetail/C86277; ComponentLink3Description: LCSC Part URL; ComponentLink3URL: https://lcsc.com/product-detail/Multilayer-Ceramic-Capacitors-MLCC---SMD-SMT_Murata-Electronics-Murata-Electronics-GRM188R61C106MA73D_C86277.html
footprint CAP-0603 (0603 (1608M) Capacitor)
pins: 1, 2

## GRM188R61C106MAALD
designator C?  Capacitance: 10uF  (hidden comment: *)
Capacitor, Ceramic (MLCC), 10uF, ±20%, 16V, X5R, ±20%, SMD 0603; Manufacturer: Murata Electronics; Manufacturer Part Number: GRM188R61C106MAALD; Package Size: 0603; JLCPCB Basic Part: No; JLCPCB Part Number: C703132; Supplier 1: LCSC; Category: Capacitors - MLCC; Supplier Part Number 1: C703132; Tolerance: ±20%; Voltage Rating: 16V; Temperature Coefficient: X5R; RoHS: Yes; ComponentLink1Description: Datasheet; ComponentLink1URL: https://wmsc.lcsc.com/wmsc/upload/file/pdf/v2/lcsc/2304140030_Murata-Electronics-GRM188R61C106MAALD_C703132.pdf; ComponentLink2Description: JLCPCB Part URL; ComponentLink2URL: https://jlcpcb.com/partdetail/C703132; ComponentLink3Description: LCSC Part URL; ComponentLink3URL: https://lcsc.com/product-detail/Multilayer-Ceramic-Capacitors-MLCC---SMD-SMT_Murata-Electronics-Murata-Electronics-GRM188R61C106MAALD_C703132.html
footprint CAP-0603 (0603 (1608M) Capacitor)
pins: 1, 2

## GRM188R61C225KE15D
designator C?  Capacitance: 2.2uF  (hidden comment: *)
Capacitor, Ceramic (MLCC), 2.2uF, ±10%, 16V, X5R, ±10%, SMD 0603; Manufacturer: Murata Electronics; Manufacturer Part Number: GRM188R61C225KE15D; Package Size: 0603; JLCPCB Basic Part: No; JLCPCB Part Number: C77183; Supplier 1: LCSC; Category: Capacitors - MLCC; Supplier Part Number 1: C77183; Tolerance: ±10%; Voltage Rating: 16V; Temperature Coefficient: X5R; RoHS: Yes; ComponentLink1Description: Datasheet; ComponentLink1URL: https://wmsc.lcsc.com/wmsc/upload/file/pdf/v2/lcsc/1810311111_Murata-Electronics-GRM188R61C225KE15D_C77183.pdf; ComponentLink2Description: JLCPCB Part URL; ComponentLink2URL: https://jlcpcb.com/partdetail/C77183; ComponentLink3Description: LCSC Part URL; ComponentLink3URL: https://lcsc.com/product-detail/Multilayer-Ceramic-Capacitors-MLCC---SMD-SMT_Murata-Electronics-Murata-Electronics-GRM188R61C225KE15D_C77183.html
footprint CAP-0603 (0603 (1608M) Capacitor)
pins: 1, 2

## GRM188R61C475KAAJD
designator C?  Capacitance: 4.7uF  (hidden comment: *)
Capacitor, Ceramic (MLCC), 4.7uF, ±10%, 16V, X5R, ±10%, SMD 0603; Manufacturer: Murata Electronics; Manufacturer Part Number: GRM188R61C475KAAJD; Package Size: 0603; JLCPCB Basic Part: No; JLCPCB Part Number: C86016; Supplier 1: LCSC; Category: Capacitors - MLCC; Supplier Part Number 1: C86016; Tolerance: ±10%; Voltage Rating: 16V; Temperature Coefficient: X5R; RoHS: Yes; ComponentLink1Description: Datasheet; ComponentLink1URL: https://wmsc.lcsc.com/wmsc/upload/file/pdf/v2/lcsc/2304140030_Murata-Electronics-GRM188R61C475KAAJD_C86016.pdf; ComponentLink2Description: JLCPCB Part URL; ComponentLink2URL: https://jlcpcb.com/partdetail/C86016; ComponentLink3Description: LCSC Part URL; ComponentLink3URL: https://lcsc.com/product-detail/Multilayer-Ceramic-Capacitors-MLCC---SMD-SMT_Murata-Electronics-Murata-Electronics-GRM188R61C475KAAJD_C86016.html
footprint CAP-0603 (0603 (1608M) Capacitor)
pins: 1, 2

## GRM188R61C475KE11D
designator C?  Capacitance: 4.7uF  (hidden comment: *)
Capacitor, Ceramic (MLCC), 4.7uF, ±10%, 16V, X5R, ±10%, SMD 0603; Manufacturer: Murata Electronics; Manufacturer Part Number: GRM188R61C475KE11D; Package Size: 0603; JLCPCB Basic Part: No; JLCPCB Part Number: C77045; Supplier 1: LCSC; Category: Capacitors - MLCC; Supplier Part Number 1: C77045; Tolerance: ±10%; Voltage Rating: 16V; Temperature Coefficient: X5R; RoHS: Yes; ComponentLink1Description: Datasheet; ComponentLink1URL: https://wmsc.lcsc.com/wmsc/upload/file/pdf/v2/lcsc/2304140030_Murata-Electronics-GRM188R61C475KE11D_C77045.pdf; ComponentLink2Description: JLCPCB Part URL; ComponentLink2URL: https://jlcpcb.com/partdetail/C77045; ComponentLink3Description: LCSC Part URL; ComponentLink3URL: https://lcsc.com/product-detail/Multilayer-Ceramic-Capacitors-MLCC---SMD-SMT_Murata-Electronics-Murata-Electronics-GRM188R61C475KE11D_C77045.html
footprint CAP-0603 (0603 (1608M) Capacitor)
pins: 1, 2

## GRM188R61C475MAAJD
designator C?  Capacitance: 4.7uF  (hidden comment: *)
Capacitor, Ceramic (MLCC), 4.7uF, ±20%, 16V, X5R, ±20%, SMD 0603; Manufacturer: Murata Electronics; Manufacturer Part Number: GRM188R61C475MAAJD; Package Size: 0603; JLCPCB Basic Part: No; JLCPCB Part Number: C909850; Supplier 1: LCSC; Category: Capacitors - MLCC; Supplier Part Number 1: C909850; Tolerance: ±20%; Voltage Rating: 16V; Temperature Coefficient: X5R; RoHS: Yes; ComponentLink1Description: Datasheet; ComponentLink1URL: https://wmsc.lcsc.com/wmsc/upload/file/pdf/v2/lcsc/2304140030_Murata-Electronics-GRM188R61C475MAAJD_C909850.pdf; ComponentLink2Description: JLCPCB Part URL; ComponentLink2URL: https://jlcpcb.com/partdetail/C909850; ComponentLink3Description: LCSC Part URL; ComponentLink3URL: https://lcsc.com/product-detail/Multilayer-Ceramic-Capacitors-MLCC---SMD-SMT_Murata-Electronics-Murata-Electronics-GRM188R61C475MAAJD_C909850.html
footprint CAP-0603 (0603 (1608M) Capacitor)
pins: 1, 2

## GRM188R61C475ME11D
designator C?  Capacitance: 4.7uF  (hidden comment: *)
Capacitor, Ceramic (MLCC), 4.7uF, ±20%, 16V, X5R, ±20%, SMD 0603; Manufacturer: Murata Electronics; Manufacturer Part Number: GRM188R61C475ME11D; Package Size: 0603; JLCPCB Basic Part: No; JLCPCB Part Number: C415373; Supplier 1: LCSC; Category: Capacitors - MLCC; Supplier Part Number 1: C415373; Tolerance: ±20%; Voltage Rating: 16V; Temperature Coefficient: X5R; RoHS: Yes; ComponentLink1Description: Datasheet; ComponentLink1URL: https://wmsc.lcsc.com/wmsc/upload/file/pdf/v2/lcsc/2304140030_Murata-Electronics-GRM188R61C475ME11D_C415373.pdf; ComponentLink2Description: JLCPCB Part URL; ComponentLink2URL: https://jlcpcb.com/partdetail/C415373; ComponentLink3Description: LCSC Part URL; ComponentLink3URL: https://lcsc.com/product-detail/Multilayer-Ceramic-Capacitors-MLCC---SMD-SMT_Murata-Electronics-Murata-Electronics-GRM188R61C475ME11D_C415373.html
footprint CAP-0603 (0603 (1608M) Capacitor)
pins: 1, 2

## GRM188R61C684KA75D
designator C?  Capacitance: 680nF  (hidden comment: *)
Capacitor, Ceramic (MLCC), 680nF, ±10%, 16V, X5R, ±10%, SMD 0603; Manufacturer: Murata Electronics; Manufacturer Part Number: GRM188R61C684KA75D; Package Size: 0603; JLCPCB Basic Part: No; JLCPCB Part Number: C437537; Supplier 1: LCSC; Category: Capacitors - MLCC; Supplier Part Number 1: C437537; Tolerance: ±10%; Voltage Rating: 16V; Temperature Coefficient: X5R; RoHS: Yes; ComponentLink1Description: Datasheet; ComponentLink1URL: https://wmsc.lcsc.com/wmsc/upload/file/pdf/v2/lcsc/2304140030_Murata-Electronics-GRM188R61C684KA75D_C437537.pdf; ComponentLink2Description: JLCPCB Part URL; ComponentLink2URL: https://jlcpcb.com/partdetail/C437537; ComponentLink3Description: LCSC Part URL; ComponentLink3URL: https://lcsc.com/product-detail/Multilayer-Ceramic-Capacitors-MLCC---SMD-SMT_Murata-Electronics-Murata-Electronics-GRM188R61C684KA75D_C437537.html
footprint CAP-0603 (0603 (1608M) Capacitor)
pins: 1, 2